# Altium footprint library PcbLib1.PcbLib: 150 footprints (part 5 of 10)
Each footprint in its own frame and in the unit in brackets; x right, y up, seen from the top. Pads: shape width x height; smd on the part's side, far side on the other; paste and mask are expansions set on the pad; w line width, h text height; cw(c..) or ccw(c..) is an arc to the next point about the centre after c.
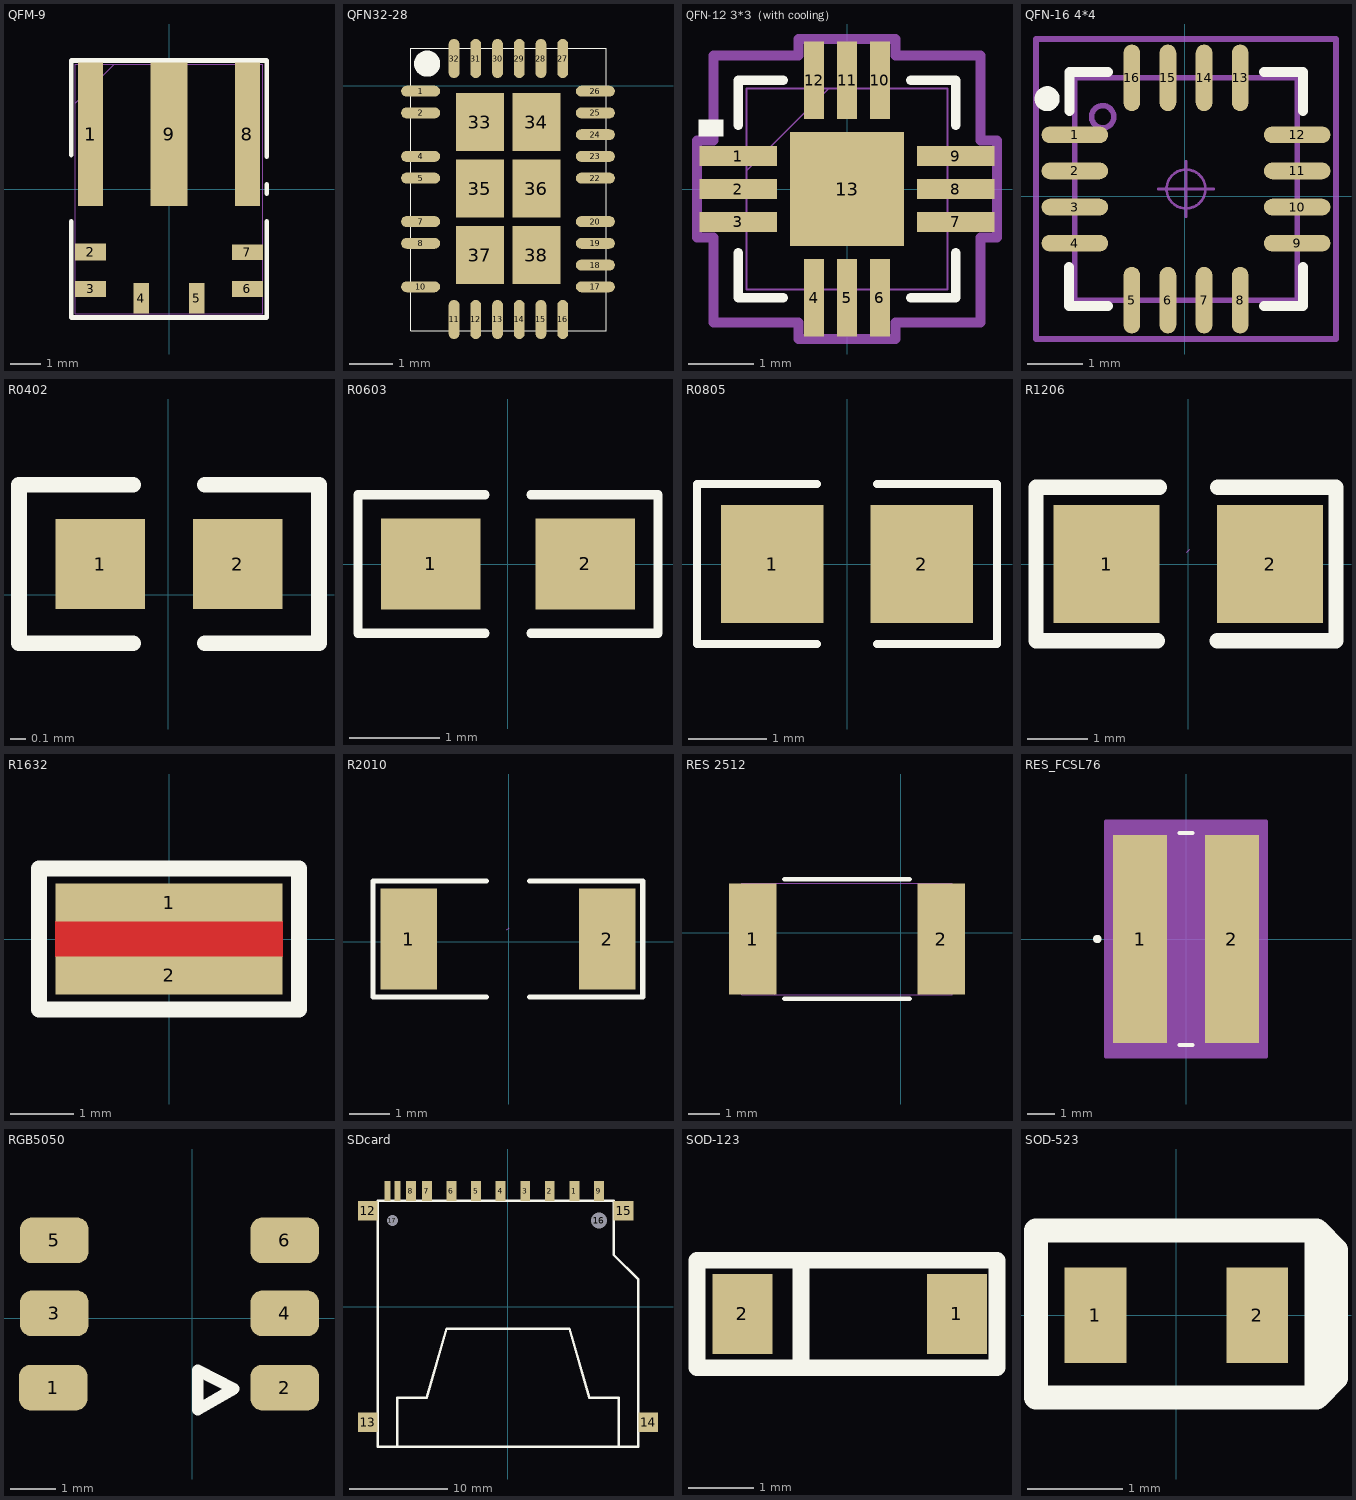
[diagram p4: the footprints below, top view; thin cyan lines are the x and y axes]

## QFM-9 [mm]
pads (9):
  rect 0.8x4.65 smd paste+0 mask+0: 1(-2.55,1.78) 8(2.55,1.78)
  rect 1x0.559 smd paste+0 mask+0: 2(-2.55,-2.05)
  rect 1x0.508 smd paste+0 mask+0: 3(-2.55,-3.25) 6(2.55,-3.25) 7(2.55,-2.05)
  rect 0.508x1 smd paste+0 mask+0: 4(-0.9,-3.55) 5(0.9,-3.55)
  rect 1.2x4.65 smd paste-2.108 mask+0: 9(0,1.78)
Top Overlay:
  lines w0.152: -3.175,-1.049 -3.175,-4.178 3.175,-4.178 3.175,-1.049 ; -3.175,1.106 -3.175,4.178 3.175,4.178 3.175,1.049 ; 3.175,-0.151 3.175,0.151
Top Paste:
  region: 0.421,2.021 -0.421,2.021 -0.421,0.807 0.421,0.807
Mechanical 13:
  lines w0.025: -3.048,2.781 -1.778,4.051 ; -3.048,-4.051 3.048,-4.051 3.048,4.051 -3.048,4.051 -3.048,-4.051
3D body: height 0.25, standoff 0, extent 0,0 0.254,0.254
3D body "User Library-QFM9_6x8x2mm_LMG5200.STEP": height 2, standoff 0, extent -3,-3.987 3,4.013

## QFN32-28 [mm]
pads (34):
  oval 0.9x0.25 smd: 1(4.15,-0.127) 2(4.15,-0.627) 4(4.15,-1.627) 5(4.15,-2.127) 7(4.15,-3.127) 8(4.15,-3.627) 10(4.15,-4.627) 17(8.167,-4.627) 18(8.167,-4.127) 19(8.167,-3.627) 20(8.167,-3.127) 22(8.167,-2.127) 23(8.167,-1.627) 24(8.167,-1.127) 25(8.167,-0.627) 26(8.167,-0.127)
  oval 0.25x0.9 smd: 11(4.917,-5.377) 12(5.417,-5.377) 13(5.917,-5.377) 14(6.417,-5.377) 15(6.917,-5.377) 16(7.417,-5.377) 27(7.417,0.623) 28(6.917,0.623) 29(6.417,0.623) 30(5.917,0.623) 31(5.417,0.623) 32(4.917,0.623)
  rect 1.1x1.33 smd: 33(5.512,-0.838) 34(6.812,-0.838) 35(5.512,-2.368) 36(6.812,-2.368) 37(5.512,-3.898) 38(6.812,-3.898)
Top Overlay:
  lines w0.025: 3.923,-5.636 8.423,-5.636 8.423,0.864 3.923,0.864 3.923,-5.636
  lines w0.3: 4.297,0.656 ccw(c4.298,0.506) 4.3,0.656

## QFN-12 3*3（with cooling） [mil]
pads (13):
  rect 47.24x12 smd: 1(-66,20) 2(-66,0) 3(-66,-20) 7(66,-20) 8(66,0) 9(66,20)
  rect 12x47.24 smd: 4(-20,-66) 5(0,-66) 6(20,-66) 10(20,66) 11(0,66) 12(-20,66)
  rect 69x69 smd paste-34: 13(0,0)
Top Overlay:
  region: -75,32 -90,32 -90,42 -75,42
  lines w6: -66,-38.78 -66,-66 -38.78,-66 ; -66,38.78 -66,66 -38.78,66 ; 38.78,-66 66,-66 66,-38.78 ; 38.78,66 66,66 66,38.78
Top Paste:
  region: 34.5,34.5 -34.5,34.5 -34.5,-34.5 34.5,-34.5
Mechanical 13:
  lines w1: -61,11 -11,61 ; -61,-61 61,-61 61,61 -61,61 -61,-61 ; -61,-25.68 -61,-13.69 -61,-25.68 ; -61,-6 -61,6 -61,-6 ; -61,13.69 -61,25.68 -61,13.69 ; -25.68,-61 -13.69,-61 -25.68,-61 ; -25.68,61 -13.69,61 -25.68,61 ; -6,-61 6,-61 -6,-61 ; -6,61 6,61 -6,61 ; 13.69,-61 25.68,-61 13.69,-61 ; 13.69,61 25.68,61 13.69,61 ; 61,-25.68 61,-13.69 61,-25.68 ; 61,-6 61,6 61,-6 ; 61,13.69 61,25.68 61,13.69
Mechanical 15:
  lines w6: -91,-29.53 -81,-29.53 -81,-81 -29.53,-81 -29.53,-91 29.53,-91 29.53,-81 81,-81 81,-29.53 91,-29.53 91,29.53 81,29.53 81,81 29.53,81 29.53,91 -29.53,91 -29.53,81 -81,81 -81,29.53 -91,29.53 -91,-29.53
3D body: height 10, standoff 0, extent 0,0 10,10
3D body "User Library-QFN12_3x3x0_8.STEP": height 30.71, standoff -0.79, extent -59.45,-59.45 59.45,59.45

## QFN-16 4*4 [mm]
pads (16):
  oval 1.2x0.3 smd: 1(-1.981,1.104) 2(-1.981,0.454) 3(-1.981,-0.196) 4(-1.981,-0.846) 9(2.019,-0.846) 10(2.019,-0.196) 11(2.019,0.454) 12(2.019,1.104)
  oval 0.3x1.2 smd: 5(-0.956,-1.871) 6(-0.306,-1.871) 7(0.344,-1.871) 8(0.994,-1.871) 13(0.994,2.129) 14(0.344,2.129) 15(-0.306,2.129) 16(-0.956,2.129)
Top Overlay:
  circle w0.25: c-2.481,1.754 r0.1
  lines w0.178: -2.087,-1.275 -2.087,-1.977 -1.385,-1.977 ; -2.081,1.533 -2.081,2.235 -1.385,2.235 ; 1.423,-1.977 2.125,-1.977 2.125,-1.275 ; 1.423,2.235 2.125,2.235 2.125,1.533
Mechanical 13:
  circle w0.1: c-1.481,1.429 r0.2
  lines w0.1: -1.981,-1.871 -1.981,2.129 2.019,2.129 2.019,-1.871 -1.981,-1.871
Mechanical 15:
  circle w0.05: c0.019,0.129 r0.35
  lines w0.05: -0.481,0.129 0.519,0.129 ; 0.019,-0.371 0.019,0.629
  lines w0.1: -2.681,-2.571 2.719,-2.571 2.719,2.829 -2.681,2.829 -2.681,-2.571
3D body "User Library-qfn16-4x4.STEP": height 0.92, standoff 0, extent -1.975,-1.866 2.025,2.134

## R0402 [mm]
pads (2):
  rect 0.566x0.566 smd: 1(-0.428,0.194) 2(0.437,0.194)
Top Overlay:
  lines w0.1: -0.222,-0.305 -0.94,-0.305 -0.94,0.692 -0.222,0.692 ; 0.231,-0.305 0.949,-0.305 0.949,0.692 0.231,0.692
Mechanical 5:
  region: 0.505,-0.056 0.505,0.444 0.255,0.444 0.255,-0.056
  region: -0.496,-0.056 -0.496,0.444 -0.246,0.444 -0.246,-0.056
3D body "RES0402_CPF_TYCO_TYC.step": height 0.36, standoff 0, extent -0.546,-0.076 0.496,0.482

## R0603 [mm]
pads (2):
  rect 1.1x1 smd: 1(-0.85,0) 2(0.85,0)
Top Overlay:
  lines w0.1: -0.254,-0.762 -1.651,-0.762 -1.651,0.762 -0.254,0.762 ; 0.254,-0.762 1.651,-0.762 1.651,0.762 0.254,0.762
3D body "R0603.STEP": height 0.45, standoff 0, extent -0.8,-0.4 0.8,0.4

## R0805 [mm]
pads (2):
  rect 1.3x1.5 smd: 1(-0.95,0) 2(0.95,0)
Top Overlay:
  lines w0.1: -0.381,-1.016 -1.905,-1.016 -1.905,1.016 -0.381,1.016 ; 0.381,-1.016 1.905,-1.016 1.905,1.016 0.381,1.016
3D body: height 0.51, standoff 0, extent -1.143,-0.508 -1.016,0.508
3D body: height 0.51, standoff 0, extent 1.016,-0.508 1.143,0.508
3D body "R0805.STEP": height 0.55, standoff 0, extent -1,-0.63 1,0.63

## R1206 [mm]
pads (2):
  rect 1.75x1.95 smd: 1(-1.35,0) 2(1.35,0)
Top Overlay:
  lines w0.254: -0.508,-1.27 -2.515,-1.27 -2.515,1.27 -0.475,1.27 ; 0.475,-1.27 2.438,-1.27 2.438,1.27 0.485,1.27
Mechanical 15:
  lines w0.003: -0.025,0.197 0.025,0.248
3D body "User Library-User Library-1206_Res1.STEP": height 1.25, standoff 0, extent -2.27,-0.825 2.27,0.775

## R1632 [mm]
pads (2):
  rect 3.6x0.6 smd: 1(0,0.575) 2(0,-0.575)
Top Layer:
  pour cut-out: -1.803,0.279 -1.803,-0.279 1.803,-0.279 1.803,0.279
Top Overlay:
  lines w0.254: -2.057,-1.118 -2.057,1.118 2.057,1.118 2.057,-1.118 -2.057,-1.118
3D body "0612.STEP": height 0.66, standoff 0, extent -1.625,-0.8 1.575,0.8

## R2010 [mil]
pads (2):
  rect 55.1x98.4 smd: 1(-97.45,2.5) 2(95.55,2.5)
Top Overlay:
  lines w5: -22,-54 -132,-54 -132,59 -22,59 ; 20,-54 130,-54 130,59 20,59
Mechanical 15:
  lines w0.1: -1.95,11.5 0.05,13.5
3D body "crl2010-jw-r330elf.stp": height 23.62, standoff 0, extent -98.43,-47.21 98.42,51.21

## RES 2512 [mil]
pads (2):
  rect 59.06x139 smd paste+0 mask+0: 1(-184.5,-8) 2(50.5,-8)
Top Overlay:
  lines w6: -144.89,-82.5 10.89,-82.5 ; -144.89,66.5 10.89,66.5
Mechanical 13:
  circle w0: c-179.5,-8 r3
  lines w1: -198,-77.5 -198,61.5 ; -198,-77.5 -157,-77.5 -157,61.5 -198,61.5 ; -198,-77.5 64,-77.5 ; -198,-77.5 -198,61.5 ; -198,61.5 64,61.5 ; 64,-77.5 23,-77.5 23,61.5 64,61.5 ; 64,-77.5 64,61.5 ; 64,-77.5 64,61.5
3D body "BO_CRA2512.step": height 35.98, standoff 0, extent -197.98,-77.48 64,61.49
3D body: height 10, standoff 0, extent -67,-8 -57,2

## RES_FCSL76 [mm]
pads (2):
  rect 2x7.72 smd paste+0 mask+0: 1(-1.707,0) 2(1.707,0)
Top Overlay:
  circle w0.152: c-3.293,0 r0.076
  lines w0.152: -0.235,-3.937 0.235,-3.937 ; -0.235,3.937 0.235,3.937
Mechanical 5:
  region: 2.836,-4.241 -2.836,-4.241 -2.836,4.241 2.836,4.241
Mechanical 13:
  circle w0: c-1.38,0 r0.076
  lines w0.025: -1.905,-3.81 -1.905,3.81 ; -1.905,-3.81 -0.559,-3.81 -0.559,3.81 -1.905,3.81 ; -1.905,-3.81 1.905,-3.81 ; -1.905,-3.81 -1.905,3.81 ; -1.905,3.81 1.905,3.81 ; 1.905,-3.81 0.559,-3.81 0.559,3.81 1.905,3.81 ; 1.905,-3.81 1.905,3.81 ; 1.905,-3.81 1.905,3.81
Mechanical 15:
  region: 2.963,-4.368 -2.963,-4.368 -2.963,4.368 2.963,4.368
  lines w0.152: -2.963,-4.368 -2.963,4.368 2.963,4.368 2.963,-4.368 -2.963,-4.368

## RGB5050 [mm]
pads (6):
  rrect50% 1.5x1 smd: 1(-3.044,-1.523) 2(2.031,-1.523) 3(-3.019,0.102) 4(2.031,0.102) 5(-3.019,1.702) 6(2.031,1.702)
Top Overlay:
  lines w0.254: 0.127,-2.007 0.127,-1.143 0.914,-1.549 0.127,-2.007
3D body "User Library-APA102C.STEP": height 1.51, standoff -0.04, extent -3.258,-2.398 2.242,2.602

## SDcard [mm]
pads (17):
  rect 1x2 smd: 1(6.75,11.75) 2(4.25,11.75) 3(1.75,11.75) 4(-0.75,11.75) 5(-3.25,11.75) 6(-5.75,11.75) 7(-8.25,11.75) 8(-9.875,11.75) 9(9.25,11.75)
  rect 0.6x2 smd: 10(-11.25,11.75) 11(-12.25,11.75)
  rect 2x2 smd: 12(-14.25,9.75) 13(-14.25,-11.75) 14(14.25,-11.75) 15(11.75,9.75)
  round 1.5 hole 1.6: 16(9.25,8.75)
  round 1 hole 1.1: 17(-11.75,8.75)
Top Overlay:
  lines w0.254: -11.25,-14.25 -11.25,-9.25 -8.25,-9.25 -6.25,-2.25 6.25,-2.25 8.25,-9.25 11.25,-9.25 11.25,-14.25 ; -13.25,-14.25 13.25,-14.25 13.25,2.75 10.75,5.25 10.75,10.75 -13.25,10.75 -13.25,-14.25
3D body "User Library-2041021-4.step": height 3.32, standoff -0.58, extent -14.103,-14.297 13.872,11.953

## SOD-123 [mil]
pads (2):
  rect 35.8x48 smd: 1(44666,45194) 2(44538,45194)
Top Overlay:
  lines w10: 44573,45226 44573,45162 ; 44573,45162 44690,45162 44690,45226 44511,45226 44511,45162 44573,45162
3D body "CircuitWorks-SOD123.STEP": height 50, standoff 0, extent 44528.16,45159.49 44673.82,45222.48

## SOD-523 [mm]
pads (2):
  rect 0.65x1 smd: 1(-0.85,0) 2(0.85,0)
Top Overlay:
  lines w0.254: 1.473,-0.864 1.676,-0.66 ; 1.473,-0.864 1.676,-0.66 ; 1.473,-0.864 -1.473,-0.864 -1.473,0.889 -1.397,0.889 1.473,0.889 ; 1.473,-0.864 1.473,0.889 ; 1.473,0.889 1.676,0.686 ; 1.473,0.889 1.676,0.686 ; 1.676,-0.66 1.676,0.686
3D body "User Library-SOD-523F.STEP": height 0.7, standoff 0, extent -0.8,-0.424 0.8,0.373